# Altium footprint library xialeste-20221201.PcbLib: 195 footprints (part 12 of 13)
Each footprint in its own frame and in the unit in brackets; x right, y up, seen from the top. Pads: shape width x height; smd on the part's side, far side on the other; paste and mask are expansions set on the pad; w line width, h text height; cw(c..) or ccw(c..) is an arc to the next point about the centre after c.
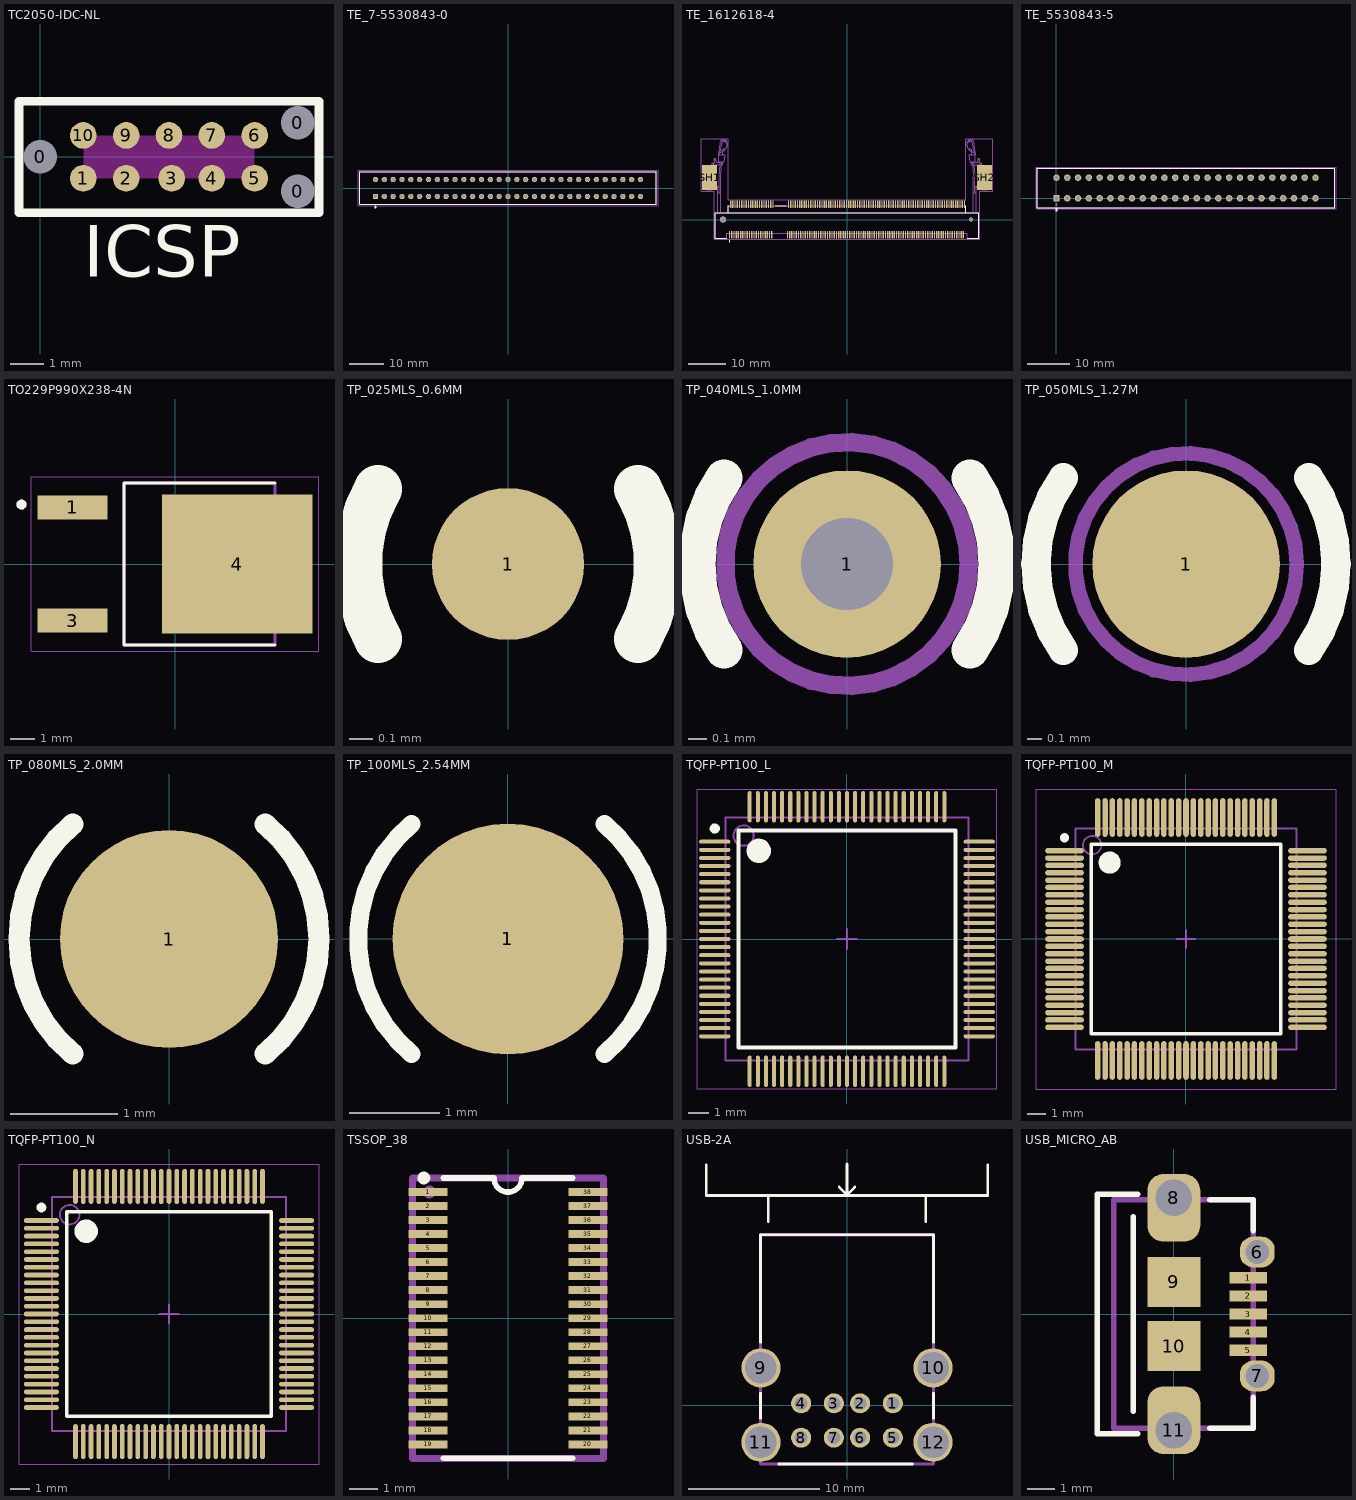
[diagram p11: the footprints below, top view; thin cyan lines are the x and y axes]

## TC2050-IDC-NL [mm] "Tag-Connect 10-Pin with No Legs (PN# TC2050-IDC-NL)"
pads (13):
  round 0.9 hole 0.995 unplated: 0(0,0) 0(7.62,-1.016) 0(7.62,1.016)
  round 0.79 smd paste-0.39: 1(1.27,-0.635) 2(2.54,-0.635) 3(3.89,-0.635) 4(5.08,-0.635) 5(6.35,-0.635) 6(6.35,0.635) 7(5.08,0.635) 8(3.81,0.635) 9(2.54,0.635) 10(1.27,0.635)
Top Overlay:
  lines w0.254: -0.635,-1.651 -0.635,1.651 8.255,1.651 8.255,-1.651 -0.635,-1.651
  text "ICSP" at 1.27,-3.556 h1.52
Keep-Out Layer:
  rectangle: 1.27,-0.635 6.35,0.635

## TE_7-5530843-0 [mil]
pads (62):
  rect 60x60 hole 40: 1(-1500,-95.5)
  round 60 hole 40: 2(-1500,95.5) 3(-1400,-95.5) 4(-1400,95.5) 5(-1300,-95.5) 6(-1300,95.5) 7(-1200,-95.5) 8(-1200,95.5) 9(-1100,-95.5) 10(-1100,95.5) 11(-1000,-95.5) 12(-1000,95.5) 13(-900,-95.5) 14(-900,95.5) 15(-800,-95.5) 16(-800,95.5) 17(-700,-95.5) 18(-700,95.5) 19(-600,-95.5) 20(-600,95.5) 21(-500,-95.5) 22(-500,95.5) 23(-400,-95.5) 24(-400,95.5) 25(-300,-95.5) 26(-300,95.5) 27(-200,-95.5) 28(-200,95.5) 29(-100,-95.5) 30(-100,95.5) 31(0,-95.5) 32(0,95.5) 33(100,-95.5) 34(100,95.5) 35(200,-95.5) 36(200,95.5) 37(300,-95.5) 38(300,95.5) 39(400,-95.5) 40(400,95.5) 41(500,-95.5) 42(500,95.5) 43(600,-95.5) 44(600,95.5) 45(700,-95.5) 46(700,95.5) 47(800,-95.5) 48(800,95.5) 49(900,-95.5) 50(900,95.5) 51(1000,-95.5) 52(1000,95.5) 53(1100,-95.5) 54(1100,95.5) 55(1200,-95.5) 56(1200,95.5) 57(1300,-95.5) 58(1300,95.5) 59(1400,-95.5) 60(1400,95.5) 61(1500,-95.5) 62(1500,95.5)
Top Overlay:
  circle w13.78: c-1500.98,-216.54 r7.87
  lines w10: -1680,-186.22 -1680,186.22 1680,186.22 1680,-186.22 -1680,-186.22
Mechanical 13:
  lines w10: -1680,-184 -1680,184 1680,184 1680,-184 -1680,-184
Mechanical 15:
  lines w1.97: -1697.83,-201.77 1697.83,-201.77 1697.83,201.77 -1697.83,201.77 -1697.83,-201.77

## TE_1612618-4 [mm]
pads (204):
  rect 0.35x2 smd: 1(-31.65,-4.1) 2(-31.35,4.1) 3(-31.05,-4.1) 4(-30.75,4.1) 5(-30.45,-4.1) 6(-30.15,4.1) 7(-29.85,-4.1) 8(-29.55,4.1) 9(-29.25,-4.1) 10(-28.95,4.1) 11(-28.65,-4.1) 12(-28.35,4.1) 13(-28.05,-4.1) 14(-27.75,4.1) 15(-27.45,-4.1) 16(-27.15,4.1) 17(-26.85,-4.1) 18(-26.55,4.1) 19(-26.25,-4.1) 20(-25.95,4.1) 21(-25.65,-4.1) 22(-25.35,4.1) 23(-25.05,-4.1) 24(-24.75,4.1) 25(-24.45,-4.1) 26(-24.15,4.1) 27(-23.85,-4.1) 28(-23.55,4.1) 29(-23.25,-4.1) 30(-22.95,4.1) 31(-22.65,-4.1) 32(-22.35,4.1) 33(-22.05,-4.1) 34(-21.75,4.1) 35(-21.45,-4.1) 36(-21.15,4.1) 37(-20.85,-4.1) 38(-20.55,4.1) 39(-20.25,-4.1) 40(-19.95,4.1) 41(-16.05,-4.1) 42(-15.75,4.1) 43(-15.45,-4.1) 44(-15.15,4.1) 45(-14.85,-4.1) 46(-14.55,4.1) 47(-14.25,-4.1) 48(-13.95,4.1) 49(-13.65,-4.1) 50(-13.35,4.1) 51(-13.05,-4.1) 52(-12.75,4.1) 53(-12.45,-4.1) 54(-12.15,4.1) 55(-11.85,-4.1) 56(-11.55,4.1) 57(-11.25,-4.1) 58(-10.95,4.1) 59(-10.65,-4.1) 60(-10.35,4.1) 61(-10.05,-4.1) 62(-9.75,4.1) 63(-9.45,-4.1) 64(-9.15,4.1) 65(-8.85,-4.1) 66(-8.55,4.1) 67(-8.25,-4.1) 68(-7.95,4.1) 69(-7.65,-4.1) 70(-7.35,4.1) 71(-7.05,-4.1) 72(-6.75,4.1) 73(-6.45,-4.1) 74(-6.15,4.1) 75(-5.85,-4.1) 76(-5.55,4.1) 77(-5.25,-4.1) 78(-4.95,4.1) 79(-4.65,-4.1) 80(-4.35,4.1) 81(-4.05,-4.1) 82(-3.75,4.1) 83(-3.45,-4.1) 84(-3.15,4.1) 85(-2.85,-4.1) 86(-2.55,4.1) 87(-2.25,-4.1) 88(-1.95,4.1) 89(-1.65,-4.1) 90(-1.35,4.1) 91(-1.05,-4.1) 92(-0.75,4.1) 93(-0.45,-4.1) 94(-0.15,4.1) 95(0.15,-4.1) 96(0.45,4.1) 97(0.75,-4.1) 98(1.05,4.1) 99(1.35,-4.1) 100(1.65,4.1) 101(1.95,-4.1) 102(2.25,4.1) 103(2.55,-4.1) 104(2.85,4.1) 105(3.15,-4.1) 106(3.45,4.1) 107(3.75,-4.1) 108(4.05,4.1) 109(4.35,-4.1) 110(4.65,4.1) 111(4.95,-4.1) 112(5.25,4.1) 113(5.55,-4.1) 114(5.85,4.1) 115(6.15,-4.1) 116(6.45,4.1) 117(6.75,-4.1) 118(7.05,4.1) 119(7.35,-4.1) 120(7.65,4.1) 121(7.95,-4.1) 122(8.25,4.1) 123(8.55,-4.1) 124(8.85,4.1) 125(9.15,-4.1) 126(9.45,4.1) 127(9.75,-4.1) 128(10.05,4.1) 129(10.35,-4.1) 130(10.65,4.1) 131(10.95,-4.1) 132(11.25,4.1) 133(11.55,-4.1) 134(11.85,4.1) 135(12.15,-4.1) 136(12.45,4.1) 137(12.75,-4.1) 138(13.05,4.1) 139(13.35,-4.1) 140(13.65,4.1) 141(13.95,-4.1) 142(14.25,4.1) 143(14.55,-4.1) 144(14.85,4.1) 145(15.15,-4.1) 146(15.45,4.1) 147(15.75,-4.1) 148(16.05,4.1) 149(16.35,-4.1) 150(16.65,4.1) 151(16.95,-4.1) 152(17.25,4.1) 153(17.55,-4.1) 154(17.85,4.1) 155(18.15,-4.1) 156(18.45,4.1) 157(18.75,-4.1) 158(19.05,4.1) 159(19.35,-4.1) 160(19.65,4.1) 161(19.95,-4.1) 162(20.25,4.1) 163(20.55,-4.1) 164(20.85,4.1) 165(21.15,-4.1) 166(21.45,4.1) 167(21.75,-4.1) 168(22.05,4.1) 169(22.35,-4.1) 170(22.65,4.1) 171(22.95,-4.1) 172(23.25,4.1) 173(23.55,-4.1) 174(23.85,4.1) 175(24.15,-4.1) 176(24.45,4.1) 177(24.75,-4.1) 178(25.05,4.1) 179(25.35,-4.1) 180(25.65,4.1) 181(25.95,-4.1) 182(26.25,4.1) 183(26.55,-4.1) 184(26.85,4.1) 185(27.15,-4.1) 186(27.45,4.1) 187(27.75,-4.1) 188(28.05,4.1) 189(28.35,-4.1) 190(28.65,4.1) 191(28.95,-4.1) 192(29.25,4.1) 193(29.55,-4.1) 194(29.85,4.1) 195(30.15,-4.1) 196(30.45,4.1) 197(30.75,-4.1) 198(31.05,4.1) 199(31.35,-4.1) 200(31.65,4.1)
  rect 4x6.8 smd: SH1(-37,11.3) SH2(37,11.3)
  round 1.6 hole 1.6 unplated: ""(-33.4,0)
  round 1.1 hole 1.1 unplated: ""(33.4,0)
Top Overlay:
  circle w0.2: c-31.65,-5.85 r0.1
  lines w0.127: -32.35,-5 -35.55,-5 -35.55,1.85 -32,1.85 ; -31.71,3.7 -32,3.7 -32,1.85 ; -19.35,3.7 -16.35,3.7 ; 32,3.7 32,1.85 ; 32.4,-5 35.55,-5 35.55,1.85 32,1.85 ; -32,1.85 32,1.85
Mechanical 13:
  circle w0.2: c-31.646,-3.325 r0.1
  lines w0.127: -36.3,14.7 -34.1,14.7 ; -35.85,9.7 -35.85,15.3 ; -35.846,9.69 -34.418,8.65 ; -34.85,1.842 -34.85,7.25 ; -34.488,18.1 ccw(c-34.45,20.25) -32.3,20.212 ; -34.402,8.64 -34.402,7.25 ; -34.4,7.4 -34.4,11.6 -34.1,14.7 ; -33.957,21.167 -34.6,17.4 ; -33.956,21.169 cw(c-33.562,21.1) -33.562,21.5 -32.947,21.5 cw(c-32.947,21.1) -32.591,21.282 ; -33.95,1.842 -33.95,7.25 -34.402,7.25 ; -33.95,7.3 -33.95,11.7 -33.7,15.4 ; -33.662,20.774 -34.3,17.4 ; -33.661,20.776 cw(c-33.269,20.7) -33.269,21.1 -33.114,21.1 cw(c-33.114,20.7) -32.783,20.924 ; -33.067,15.658 cw(c-33.263,15.7) -33.263,15.5 -34.4,15.5 cw(c-34.4,15.7) -34.6,15.7 -34.6,17.4 ; -33.067,15.66 -32.758,17.16 ccw(c-32.954,17.2) -32.954,17.4 -34.3,17.4 ; -32.781,20.922 -32.7,20.8 ; -32.589,21.279 -32.4,20.9 ; 32.3,20.212 ccw(c34.45,20.25) 34.488,18.1 ; 32.589,21.279 32.4,20.9 ; 32.591,21.282 cw(c32.947,21.1) 32.947,21.5 33.563,21.5 cw(c33.562,21.1) 33.956,21.169 ; 32.781,20.922 32.7,20.8 ; 32.783,20.924 cw(c33.114,20.7) 33.114,21.1 33.269,21.1 cw(c33.269,20.7) 33.661,20.776 ; 33.067,15.658 ccw(c33.263,15.7) 33.263,15.5 34.4,15.5 ccw(c34.4,15.7) 34.6,15.7 34.6,17.4 ; 33.067,15.66 32.758,17.16 cw(c32.954,17.2) 32.954,17.4 34.3,17.4 ; 33.662,20.774 34.3,17.4 ; 33.7,15.4 33.95,11.7 33.95,7.3 ; 33.95,1.842 33.95,7.25 34.402,7.25 ; 33.957,21.167 34.6,17.4 ; 34.4,7.4 34.4,11.6 34.1,14.7 ; 34.402,8.64 34.402,7.25 ; 34.418,8.65 35.846,9.69 ; 34.85,1.842 34.85,7.25 ; 35.85,9.7 35.85,15.3 ; 36.3,14.7 34.1,14.7 ; -36.35,9.692 -36.35,14.5 ; -36.35,9.692 -36.35,8 -37.95,8 -37.95,14.5 -36.35,14.5 ; -36.35,9.692 -34.85,8.65 -34.85,7.25 ; -36.35,14.5 -36.35,15.3 -35.85,15.3 ; -35.85,15.3 -35.6,15.3 -35.6,15.7 -35.8,15.8 -35.8,16.2 ; -35.8,16.2 -35.8,16.45 -35.4,16.45 -35.4,16.2 ; -35.8,16.2 -35.4,16.2 ; -35.4,16.2 -35.4,15.8 -35.2,15.4 -34.1,15.4 ; -34.85,7.25 -34.402,7.25 ; -34.6,17.4 -34.3,17.4 ; -34.1,14.7 -34.1,15.4 ; -34.1,14.7 -33.5,14.7 -33.5,15.4 -34.1,15.4 ; -32.7,20.8 -32.4,20.9 ; -32.7,20.8 -32.4,20.6 -32.4,20.9 ; -32,1.85 32,1.85 ; -32,1.85 -35.55,1.85 -35.55,-5 -32.35,-5 -32.35,-3.7 32.4,-3.7 32.4,-5 35.55,-5 35.55,1.85 32,1.85 ; -32,1.85 -32,3.7 32,3.7 32,1.85 ; 32.4,20.9 32.7,20.8 ; 32.4,20.9 32.4,20.6 32.7,20.8 ; 34.1,14.7 34.1,15.4 ; 34.1,14.7 33.5,14.7 33.5,15.4 34.1,15.4 ; 34.1,15.4 35.2,15.4 35.4,15.8 35.4,16.2 ; 34.3,17.4 34.6,17.4 ; 34.402,7.25 34.85,7.25 ; 34.85,7.25 34.85,8.65 36.35,9.692 ; 35.4,16.2 35.4,16.45 35.8,16.45 35.8,16.2 ; 35.4,16.2 35.8,16.2 ; 35.8,16.2 35.8,15.8 35.6,15.7 35.6,15.3 35.85,15.3 ; 35.85,15.3 36.35,15.3 36.35,14.5 ; 36.35,9.692 36.35,14.5 ; 36.35,9.692 36.35,8 37.95,8 37.95,14.5 36.35,14.5
  lines w0.254: -33.701,18.205 cw(c-33.1,18.3) -33.195,18.901 ; -33.7,18.2 ccw(c-32.9,18.2) -32.9,17.4 ; -33.206,18.899 ccw(c-33.4,20) -32.299,20.194 ; -32.4,20.6 -32.3,20.2 ; 32.299,20.194 ccw(c33.4,20) 33.206,18.899 ; 32.3,20.2 32.4,20.6 ; 32.9,17.4 ccw(c32.9,18.2) 33.7,18.2 ; 33.195,18.901 cw(c33.1,18.3) 33.701,18.205
Mechanical 15:
  lines w0.05: -39.25,7.65 -35.8,7.65 -35.8,-5.35 35.8,-5.35 35.8,7.65 39.25,7.65 39.25,21.75 32,21.75 32,5.35 -32,5.35 -32,21.75 -39.25,21.75 -39.25,7.65

## TE_5530843-5 [mil]
pads (50):
  rect 60x60 hole 40: 1(0,0)
  round 60 hole 40: 2(0,191) 3(100,0) 4(100,191) 5(200,0) 6(200,191) 7(300,0) 8(300,191) 9(400,0) 10(400,191) 11(500,0) 12(500,191) 13(600,0) 14(600,191) 15(700,0) 16(700,191) 17(800,0) 18(800,191) 19(900,0) 20(900,191) 21(1000,0) 22(1000,191) 23(1100,0) 24(1100,191) 25(1200,0) 26(1200,191) 27(1300,0) 28(1300,191) 29(1400,0) 30(1400,191) 31(1500,0) 32(1500,191) 33(1600,0) 34(1600,191) 35(1700,0) 36(1700,191) 37(1800,0) 38(1800,191) 39(1900,0) 40(1900,191) 41(2000,0) 42(2000,191) 43(2100,0) 44(2100,191) 45(2200,0) 46(2200,191) 47(2300,0) 48(2300,191) 49(2400,0) 50(2400,191)
Top Overlay:
  circle w7.87: c0,-110 r7.87
  lines w5: -180,-88.5 2580,-88.5 2580,279.49 -180,279.49 -180,-88.5
Mechanical 13:
  circle w7.87: c0,-60 r7.87
  lines w5: -180,-88.5 2580,-88.5 2580,279.49 -180,279.49 -180,-88.5
Mechanical 15:
  lines w1.97: -189.84,-98.35 -189.84,289.33 2589.84,289.33 2589.84,-98.35 -189.84,-98.35
3D body "c-5530843-5-f-3d.stp": height 610, standoff -125, extent -185,-89 2575,279

## TO229P990X238-4N [mm]
pads (3):
  rect 2.83x0.97 smd: 1(-4.14,2.29) 3(-4.14,-2.29)
  rect 6.09x5.63 smd paste-4: 4(2.51,0)
Top Overlay:
  circle w0.2: c-6.2,2.4 r0.1
  lines w0.127: 4.03,-3.27 -2.065,-3.27 -2.065,3.27 4.03,3.27
Mechanical 13:
  circle w0.2: c-6.2,2.4 r0.1
  lines w0.127: -2.065,-3.27 4.03,-3.27 4.03,3.27 -2.065,3.27 -2.065,-3.27
Mechanical 15:
  lines w0.05: -5.81,-3.52 5.81,-3.52 5.81,3.52 -5.81,3.52 -5.81,-3.52
3D body "step_temp.STEP": height 2.39, standoff -0.13, extent -4.953,-3.25 4.953,3.25

## TP_025MLS_0.6MM [mm]
pads (1):
  round 0.635 smd paste-0.635 mask+0.051: 1(0,0)
Top Overlay:
  lines w0.2: -0.543,-0.314 cw(c0,0) -0.543,0.314 ; 0.543,-0.314 ccw(c0,0) 0.543,0.314
Mechanical 13:
  text "'.Designator'" at -5.822,0.875 h1

## TP_040MLS_1.0MM [mil] "Testpoint, Surface Mounting, Circular, Pad Diameter 1mm"
pads (1):
  round 40 hole 19.68: 1(0,0)
Top Overlay:
  lines w7.87: -26.21,-18.35 cw(c0,0) -26.21,18.35 ; 26.21,-18.35 ccw(c0,0) 26.21,18.35
Mechanical 15:
  circle w3.94: c0,0 r26

## TP_050MLS_1.27M [mm] "Testpoint, Surface Mounting, Circular, Pad Diameter 1.27mm"
pads (1):
  round 1.27 smd: 1(0,0)
Top Overlay:
  lines w0.2: -0.832,-0.583 cw(c0,0) -0.832,0.583 ; 0.832,-0.583 ccw(c0,0) 0.832,0.583
Mechanical 13:
  text "'.Designator'" at -5.815,1.64 h1
Mechanical 15:
  circle w0.1: c0,0 r0.75

## TP_080MLS_2.0MM [mil] "Testpoint, Surface Mounting, Circular, Pad Diameter 2mm"
pads (1):
  round 80 smd: 1(0,0)
Top Overlay:
  lines w7.87: -35.35,-42.13 cw(c0,0) -35.35,42.13 ; 35.35,-42.13 ccw(c0,0) 35.35,42.13
Mechanical 13:
  text "'.Designator'" at -228.93,64.58 h39.37
Mechanical 15:
  circle w3.94: c0,0 r29.53

## TP_100MLS_2.54MM [mm] "Testpoint, Surface Mounting, Circular, Pad Diameter 2.54mm"
pads (1):
  round 2.54 smd: 1(0,0)
Top Overlay:
  lines w0.2: -1.061,-1.265 cw(c0,0) -1.061,1.265 ; 1.061,-1.265 ccw(c0,0) 1.061,1.265
Mechanical 13:
  text "'.Designator'" at -5.815,1.64 h1
Mechanical 15:
  circle w0.1: c0,0 r0.75

## TQFP-PT100_L [mm] "Thin QFP, 100-Leads, Body 12x12mm, Pitch 0.4mm, IPC High Density"
height 1.2
pads (100):
  oval 1.55x0.2 smd: 1(-6.525,4.8) 2(-6.525,4.4) 3(-6.525,4) 4(-6.525,3.6) 5(-6.525,3.2) 6(-6.525,2.8) 7(-6.525,2.4) 8(-6.525,2) 9(-6.525,1.6) 10(-6.525,1.2) 11(-6.525,0.8) 12(-6.525,0.4) 13(-6.525,0) 14(-6.525,-0.4) 15(-6.525,-0.8) 16(-6.525,-1.2) 17(-6.525,-1.6) 18(-6.525,-2) 19(-6.525,-2.4) 20(-6.525,-2.8) 21(-6.525,-3.2) 22(-6.525,-3.6) 23(-6.525,-4) 24(-6.525,-4.4) 25(-6.525,-4.8) 51(6.525,-4.8) 52(6.525,-4.4) 53(6.525,-4) 54(6.525,-3.6) 55(6.525,-3.2) 56(6.525,-2.8) 57(6.525,-2.4) 58(6.525,-2) 59(6.525,-1.6) 60(6.525,-1.2) 61(6.525,-0.8) 62(6.525,-0.4) 63(6.525,0) 64(6.525,0.4) 65(6.525,0.8) 66(6.525,1.2) 67(6.525,1.6) 68(6.525,2) 69(6.525,2.4) 70(6.525,2.8) 71(6.525,3.2) 72(6.525,3.6) 73(6.525,4) 74(6.525,4.4) 75(6.525,4.8)
  oval 0.2x1.55 smd: 26(-4.8,-6.525) 27(-4.4,-6.525) 28(-4,-6.525) 29(-3.6,-6.525) 30(-3.2,-6.525) 31(-2.8,-6.525) 32(-2.4,-6.525) 33(-2,-6.525) 34(-1.6,-6.525) 35(-1.2,-6.525) 36(-0.8,-6.525) 37(-0.4,-6.525) 38(0,-6.525) 39(0.4,-6.525) 40(0.8,-6.525) 41(1.2,-6.525) 42(1.6,-6.525) 43(2,-6.525) 44(2.4,-6.525) 45(2.8,-6.525) 46(3.2,-6.525) 47(3.6,-6.525) 48(4,-6.525) 49(4.4,-6.525) 50(4.8,-6.525) 76(4.8,6.525) 77(4.4,6.525) 78(4,6.525) 79(3.6,6.525) 80(3.2,6.525) 81(2.8,6.525) 82(2.4,6.525) 83(2,6.525) 84(1.6,6.525) 85(1.2,6.525) 86(0.8,6.525) 87(0.4,6.525) 88(0,6.525) 89(-0.4,6.525) 90(-0.8,6.525) 91(-1.2,6.525) 92(-1.6,6.525) 93(-2,6.525) 94(-2.4,6.525) 95(-2.8,6.525) 96(-3.2,6.525) 97(-3.6,6.525) 98(-4,6.525) 99(-4.4,6.525) 100(-4.8,6.525)
Top Overlay:
  circle w0.25: c-6.525,5.45 r0.125
  circle w0.6: c-4.35,4.35 r0.3
  lines w0.2: -5.35,-5.35 -5.35,5.35 5.35,5.35 5.35,-5.35 -5.35,-5.35
Mechanical 13:
  circle w0.1: c-5.1,5.1 r0.5
  lines w0.1: -6,-6 -6,6 6,6 6,-6 -6,-6
Mechanical 15:
  lines w0.05: -7.4,-7.4 -7.4,7.4 7.4,7.4 7.4,-7.4 -7.4,-7.4
  lines w0.1: -0.5,0 0.5,0 ; 0,-0.5 0,0.5
3D body: height 1.2, standoff 0, extent -6,-6 6,6

## TQFP-PT100_M [mm] "Thin QFP, 100-Leads, Body 12x12mm, Pitch 0.4mm, IPC Low Density"
height 1.2
pads (100):
  oval 2.1x0.3 smd: 1(-6.6,4.8) 2(-6.6,4.4) 3(-6.6,4) 4(-6.6,3.6) 5(-6.6,3.2) 6(-6.6,2.8) 7(-6.6,2.4) 8(-6.6,2) 9(-6.6,1.6) 10(-6.6,1.2) 11(-6.6,0.8) 12(-6.6,0.4) 13(-6.6,0) 14(-6.6,-0.4) 15(-6.6,-0.8) 16(-6.6,-1.2) 17(-6.6,-1.6) 18(-6.6,-2) 19(-6.6,-2.4) 20(-6.6,-2.8) 21(-6.6,-3.2) 22(-6.6,-3.6) 23(-6.6,-4) 24(-6.6,-4.4) 25(-6.6,-4.8) 51(6.6,-4.8) 52(6.6,-4.4) 53(6.6,-4) 54(6.6,-3.6) 55(6.6,-3.2) 56(6.6,-2.8) 57(6.6,-2.4) 58(6.6,-2) 59(6.6,-1.6) 60(6.6,-1.2) 61(6.6,-0.8) 62(6.6,-0.4) 63(6.6,0) 64(6.6,0.4) 65(6.6,0.8) 66(6.6,1.2) 67(6.6,1.6) 68(6.6,2) 69(6.6,2.4) 70(6.6,2.8) 71(6.6,3.2) 72(6.6,3.6) 73(6.6,4) 74(6.6,4.4) 75(6.6,4.8)
  oval 0.3x2.1 smd: 26(-4.8,-6.6) 27(-4.4,-6.6) 28(-4,-6.6) 29(-3.6,-6.6) 30(-3.2,-6.6) 31(-2.8,-6.6) 32(-2.4,-6.6) 33(-2,-6.6) 34(-1.6,-6.6) 35(-1.2,-6.6) 36(-0.8,-6.6) 37(-0.4,-6.6) 38(0,-6.6) 39(0.4,-6.6) 40(0.8,-6.6) 41(1.2,-6.6) 42(1.6,-6.6) 43(2,-6.6) 44(2.4,-6.6) 45(2.8,-6.6) 46(3.2,-6.6) 47(3.6,-6.6) 48(4,-6.6) 49(4.4,-6.6) 50(4.8,-6.6) 76(4.8,6.6) 77(4.4,6.6) 78(4,6.6) 79(3.6,6.6) 80(3.2,6.6) 81(2.8,6.6) 82(2.4,6.6) 83(2,6.6) 84(1.6,6.6) 85(1.2,6.6) 86(0.8,6.6) 87(0.4,6.6) 88(0,6.6) 89(-0.4,6.6) 90(-0.8,6.6) 91(-1.2,6.6) 92(-1.6,6.6) 93(-2,6.6) 94(-2.4,6.6) 95(-2.8,6.6) 96(-3.2,6.6) 97(-3.6,6.6) 98(-4,6.6) 99(-4.4,6.6) 100(-4.8,6.6)
Top Overlay:
  circle w0.6: c-4.15,4.15 r0.3
  circle w0.25: c-6.6,5.5 r0.125
  lines w0.2: -5.15,-5.15 5.15,-5.15 5.15,5.15 -5.15,5.15 -5.15,-5.15
Mechanical 13:
  circle w0.1: c-5.1,5.1 r0.5
  lines w0.1: -6,-6 6,-6 6,6 -6,6 -6,-6
Mechanical 15:
  lines w0.05: -8.15,-8.15 8.15,-8.15 8.15,8.15 -8.15,8.15 -8.15,-8.15
  lines w0.1: -0.5,0 0.5,0 ; 0,-0.5 0,0.5
3D body: height 1.2, standoff 0, extent -6,-6 6,6

## TQFP-PT100_N [mm] "Thin QFP, 100-Leads, Body 12x12mm, Pitch 0.4mm, IPC Medium Density"
height 1.2
pads (100):
  oval 1.8x0.24 smd: 1(-6.55,4.8) 2(-6.55,4.4) 3(-6.55,4) 4(-6.55,3.6) 5(-6.55,3.2) 6(-6.55,2.8) 7(-6.55,2.4) 8(-6.55,2) 9(-6.55,1.6) 10(-6.55,1.2) 11(-6.55,0.8) 12(-6.55,0.4) 13(-6.55,0) 14(-6.55,-0.4) 15(-6.55,-0.8) 16(-6.55,-1.2) 17(-6.55,-1.6) 18(-6.55,-2) 19(-6.55,-2.4) 20(-6.55,-2.8) 21(-6.55,-3.2) 22(-6.55,-3.6) 23(-6.55,-4) 24(-6.55,-4.4) 25(-6.55,-4.8) 51(6.55,-4.8) 52(6.55,-4.4) 53(6.55,-4) 54(6.55,-3.6) 55(6.55,-3.2) 56(6.55,-2.8) 57(6.55,-2.4) 58(6.55,-2) 59(6.55,-1.6) 60(6.55,-1.2) 61(6.55,-0.8) 62(6.55,-0.4) 63(6.55,0) 64(6.55,0.4) 65(6.55,0.8) 66(6.55,1.2) 67(6.55,1.6) 68(6.55,2) 69(6.55,2.4) 70(6.55,2.8) 71(6.55,3.2) 72(6.55,3.6) 73(6.55,4) 74(6.55,4.4) 75(6.55,4.8)
  oval 0.24x1.8 smd: 26(-4.8,-6.55) 27(-4.4,-6.55) 28(-4,-6.55) 29(-3.6,-6.55) 30(-3.2,-6.55) 31(-2.8,-6.55) 32(-2.4,-6.55) 33(-2,-6.55) 34(-1.6,-6.55) 35(-1.2,-6.55) 36(-0.8,-6.55) 37(-0.4,-6.55) 38(0,-6.55) 39(0.4,-6.55) 40(0.8,-6.55) 41(1.2,-6.55) 42(1.6,-6.55) 43(2,-6.55) 44(2.4,-6.55) 45(2.8,-6.55) 46(3.2,-6.55) 47(3.6,-6.55) 48(4,-6.55) 49(4.4,-6.55) 50(4.8,-6.55) 76(4.8,6.55) 77(4.4,6.55) 78(4,6.55) 79(3.6,6.55) 80(3.2,6.55) 81(2.8,6.55) 82(2.4,6.55) 83(2,6.55) 84(1.6,6.55) 85(1.2,6.55) 86(0.8,6.55) 87(0.4,6.55) 88(0,6.55) 89(-0.4,6.55) 90(-0.8,6.55) 91(-1.2,6.55) 92(-1.6,6.55) 93(-2,6.55) 94(-2.4,6.55) 95(-2.8,6.55) 96(-3.2,6.55) 97(-3.6,6.55) 98(-4,6.55) 99(-4.4,6.55) 100(-4.8,6.55)
Top Overlay:
  circle w0.25: c-6.55,5.47 r0.125
  circle w0.6: c-4.25,4.25 r0.3
  lines w0.2: -5.25,-5.25 -5.25,5.25 5.25,5.25 5.25,-5.25 -5.25,-5.25
Mechanical 13:
  circle w0.1: c-5.1,5.1 r0.5
  lines w0.1: -6,-6 -6,6 6,6 6,-6 -6,-6
Mechanical 15:
  lines w0.05: -7.7,-7.7 -7.7,7.7 7.7,7.7 7.7,-7.7 -7.7,-7.7
  lines w0.1: -0.5,0 0.5,0 ; 0,-0.5 0,0.5
3D body: height 1.2, standoff 0, extent -6,-6 6,6

## TSSOP_38 [mm]
pads (38):
  rect 1.4x0.28 smd mask+0.025: 1(-2.85,4.5) 2(-2.85,4) 3(-2.85,3.5) 4(-2.85,3) 5(-2.85,2.5) 6(-2.85,2) 7(-2.85,1.5) 8(-2.85,1) 9(-2.85,0.5) 10(-2.85,0) 11(-2.85,-0.5) 12(-2.85,-1) 13(-2.85,-1.5) 14(-2.85,-2) 15(-2.85,-2.5) 16(-2.85,-3) 17(-2.85,-3.5) 18(-2.85,-4) 19(-2.85,-4.5) 20(2.85,-4.5) 21(2.85,-4) 22(2.85,-3.5) 23(2.85,-3) 24(2.85,-2.5) 25(2.85,-2) 26(2.85,-1.5) 27(2.85,-1) 28(2.85,-0.5) 29(2.85,0) 30(2.85,0.5) 31(2.85,1) 32(2.85,1.5) 33(2.85,2) 34(2.85,2.5) 35(2.85,3) 36(2.85,3.5) 37(2.85,4) 38(2.85,4.5)
Top Overlay:
  circle w0.254: c-3,5 r0.1
  lines w0.2: -2.3,-5 2.3,-5 ; -2.3,5 -0.5,5 ccw(c-0.001,5) 0.499,5 ; 0.5,5 2.3,5
Mechanical 29:
  circle w0.254: c-2.8,4.5 r0.1
  lines w0.254: -3.4,-5 3.4,-5 3.4,5 -3.4,5 -3.4,-5
  text ".Designator" at -0.5,0.8 h1.52
3D body: height 1.2, standoff 0, extent -2.3,-5 2.3,5

## USB-2A [mm]
pads (12):
  round 1.524 hole 1: 1(3.5,0.13) 2(1,0.13) 3(-1,0.13) 4(-3.5,0.13) 5(3.5,-2.49) 6(1,-2.49) 7(-1,-2.49) 8(-3.5,-2.49)
  round 3 hole 2.4: 9(-6.57,2.84) 10(6.57,2.84) 11(-6.57,-2.84) 12(6.57,-2.84)
Top Overlay:
  lines w0.2: -10.75,18.35 -10.75,16 10.75,16 10.75,18.35 ; -6.6,-1 -6.6,0.9 ; -6.6,4.8 -6.6,13 6.6,13 6.6,4.8 ; -6,14 -6,16 ; -5.2,-4.5 5,-4.5 ; -0.6,16.65 0,16.05 ; 0,18.4 0,16.05 ; 0.6,16.65 0,16.05 ; 6,14 6,16 ; 6.6,-1 6.6,0.9
Mechanical 29:
  lines w0.254: -6.6,-4.5 -6.6,13 6.6,13 6.6,-4.5 -6.6,-4.5
  text ".Designator" at -2,5.8 h1.52
3D body "usb double.STEP": height 15.69, standoff -3.06, extent -7.798,-4.458 7.798,13.462

## USB_MICRO_AB [mm] "Creator MM"
height 3
pads (11):
  rect 1.35x0.4 smd mask+0.025: 1(2.675,1.3) 2(2.675,0.65) 3(2.675,0) 4(2.675,-0.65) 5(2.675,-1.3)
  rrect84% 1.25x1.1 hole 0.85 mask+0.04: 6(3,2.225) 7(3,-2.225)
  rrect60% 1.9x2.425 hole 1.3 copper offset 0,-0.363: 8(0,4.175)
  rect 1.9x1.8 smd paste-10: 9(0,1.15) 10(0,-1.15)
  rrect60% 1.9x2.425 hole 1.3 copper offset 0,0.363: 11(0,-4.175)
Top Overlay:
  lines w0.2: -1.45,-3.5 -1.45,3.5 ; -1.3,-4.3 -2.75,-4.3 -2.75,4.3 -1.3,4.3 ; 1.3,-4.1 2.85,-4.1 2.85,-3 ; 1.3,4.1 2.85,4.1 2.85,3
Mechanical 29:
  lines w0.2: -2.15,-4.1 2.85,-4.1 2.85,4.1 -2.15,4.1 -2.15,-4.1
  text ".Designator" at 1.2,-1.9 h1.52
3D body "475890001.stp": height 2.76, standoff -0.58, extent -2.75,-4.325 3.045,4.325